# Altium footprint library Item_pcb.PcbLib: 282 footprints (part 14 of 18)
Each footprint in its own frame and in the unit in brackets; x right, y up, seen from the top. Pads: shape width x height; smd on the part's side, far side on the other; paste and mask are expansions set on the pad; w line width, h text height; cw(c..) or ccw(c..) is an arc to the next point about the centre after c.
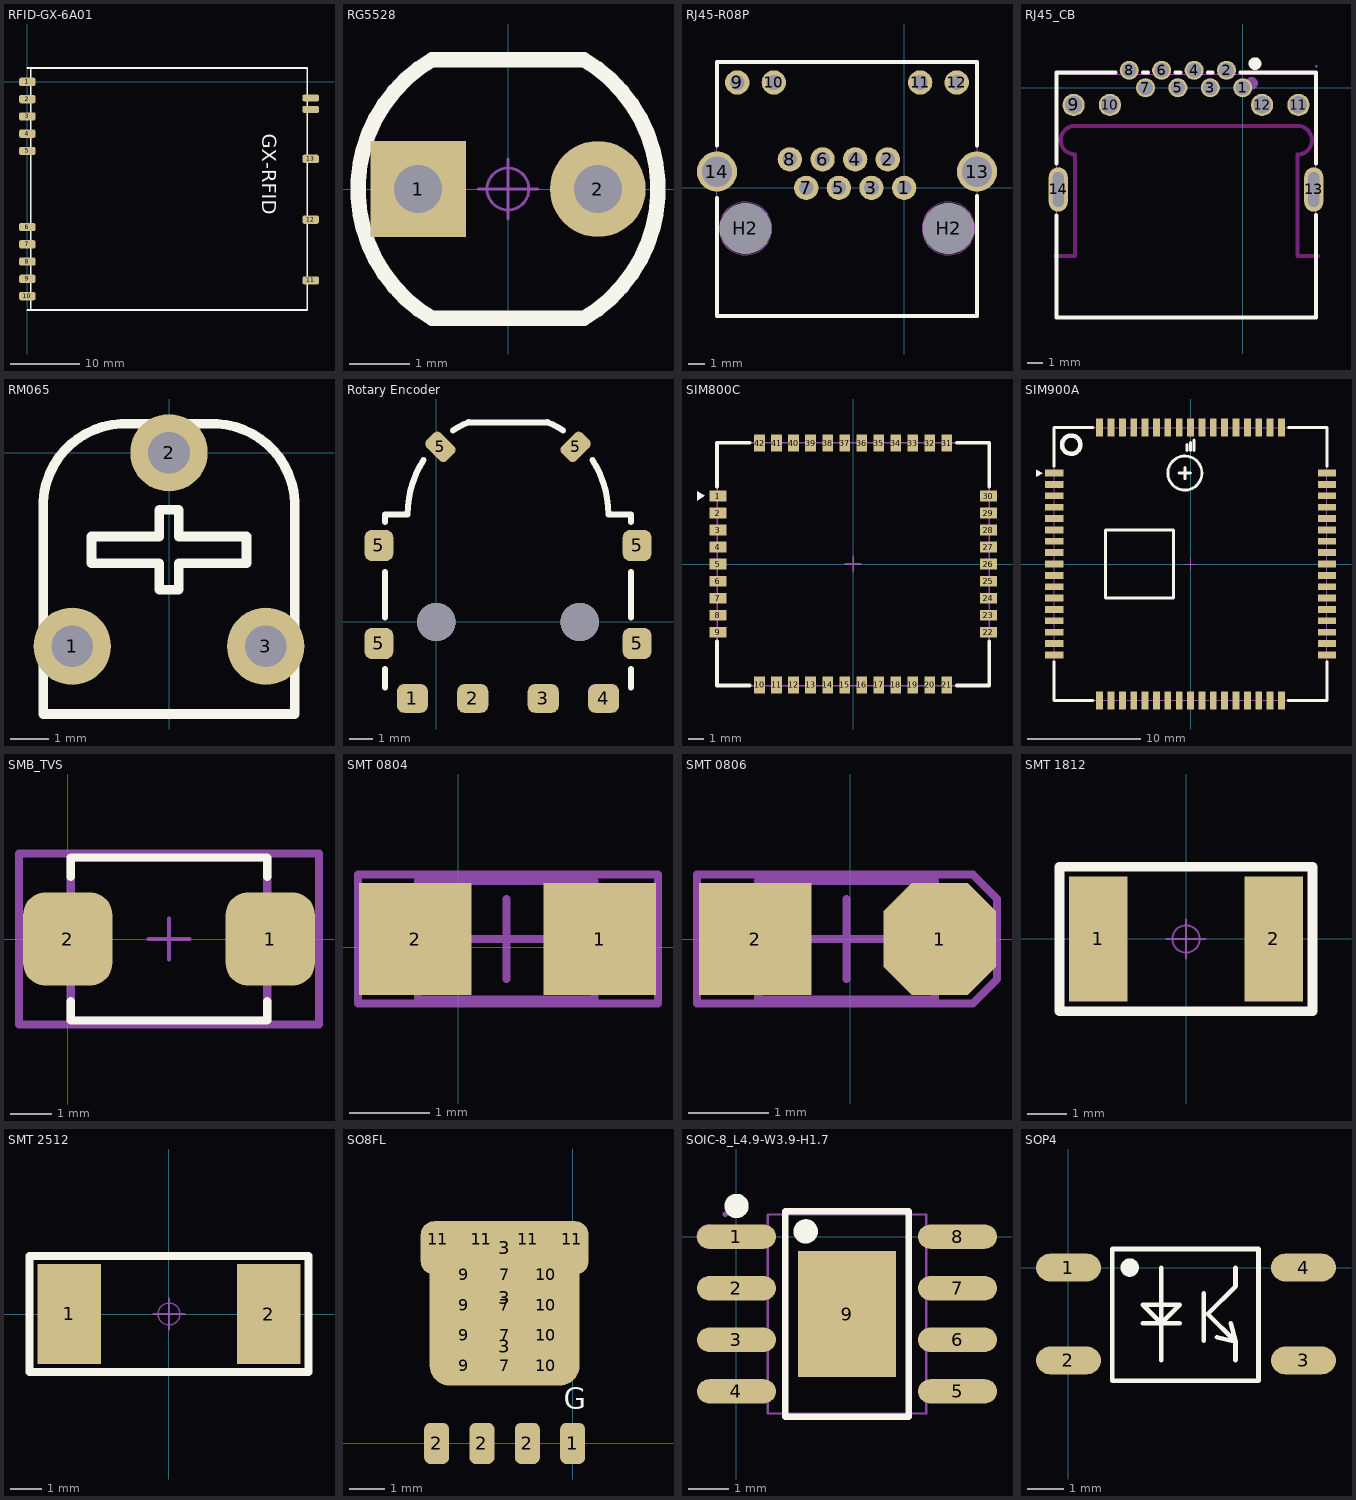
[diagram p13: the footprints below, top view; thin cyan lines are the x and y axes]

## RFID-GX-6A01 [mm]
pads (15):
  rrect50% 2.4x1.2 smd: 1(0,0) 2(0,-2.5) 3(0,-5) 4(0,-7.5) 5(0,-10) 6(0,-21) 7(0,-23.5) 8(0,-26) 9(0,-28.5) 10(0,-31) 11(41,-28.735) 12(41,-19.935) 13(41,-11.135)
  rrect50% 2.4x1 smd: 14(41,-3.985) 15(41,-2.335)
Top Overlay:
  lines w0.254: 0,-33 0.5,-33 ; 0,2 0.5,2 ; 0.5,-33 0.5,2 ; 0.5,-33 40.5,-33 40.5,2 0.5,2
  text "GX-RFID" at 33.274,-7.493 h3.56
3D body: height 3, standoff 0.1, extent 0.508,-33.02 40.64,2.032

## RG5528 [mm] "LIght"
pads (2):
  rect 1.6x1.6 hole 0.8: 1(-1.5,0)
  round 1.6 hole 0.8: 2(1.5,0)
Top Overlay:
  lines w0.254: -1.27,-2.159 cw(c0,0) -1.27,2.159 1.27,2.159 cw(c0,0) 1.27,-2.159 -1.27,-2.159
Mechanical 15:
  circle w0.05: c0,0 r0.35
  lines w0.05: -0.5,0 0.5,0 ; 0,-0.5 0,0.5
3D body "RG5528.STEP": height 4.9, standoff -0.45, extent -2.5,-2.15 2.5,2.15

## RJ45-R08P [mil]
pads (16):
  round 60 hole 36: 1(0,0) 2(-40.16,70.08) 3(-80.31,0.01) 4(-120.47,70.08) 5(-160.63,0) 6(-200.79,70.08) 7(-240.94,0.01) 8(-281.1,70.08) 9(-410.63,259.45) 10(-320.47,259.45) 11(39.37,259.45) 12(129.53,259.45)
  round 98.42 hole 74.8: 13(179.53,40.16) 14(-460.63,40.16)
  round 125.98 hole 125.98: H2(-390.55,-100) H2(109.45,-100)
Top Overlay:
  lines w10: -460.63,104.72 -460.63,309.72 179.53,309.72 179.53,104.72 ; -460.55,-25.28 -460.55,-315.28 179.45,-315.28 179.45,-20.28
Mechanical 1:
  circle w0.2: c-390.55,-100 r64.96
  circle w0.2: c109.45,-100 r64.96
Mechanical 15:
  region: 179.53,-310.24 178.55,-310.24 177.17,-311.63 177.17,-313.58 178.55,-314.97 179.53,-314.97 180.51,-314.96 181.89,-313.58 181.89,-311.62 180.51,-310.24
  region: -420.67,269.49 -400.59,269.49 -400.59,249.41 -420.67,249.41
  region: -330.51,269.49 -310.43,269.49 -310.43,249.41 -330.51,249.41
  region: 29.33,269.49 49.41,269.49 49.41,249.41 29.33,249.41
  region: 119.49,269.49 139.57,269.49 139.57,249.41 119.49,249.41
  region: 167.72,10.63 167.72,69.69 179.53,69.69 179.53,10.63
  region: -460.63,10.63 -460.63,69.69 -448.82,69.69 -448.82,10.63
  region: -9.84,9.84 9.84,9.84 9.84,-9.84 -9.84,-9.84
  region: -50,79.92 -30.32,79.92 -30.32,60.24 -50,60.24
  region: -90.15,9.84 -70.47,9.84 -70.47,-9.84 -90.15,-9.84
  region: -130.31,79.92 -110.63,79.92 -110.63,60.24 -130.31,60.24
  region: -170.47,9.84 -150.79,9.84 -150.79,-9.84 -170.47,-9.84
  region: -210.63,79.92 -190.95,79.92 -190.95,60.24 -210.63,60.24
  region: -250.78,9.84 -231.1,9.84 -231.1,-9.84 -250.78,-9.84
  region: -290.94,79.92 -271.26,79.92 -271.26,60.24 -290.94,60.24
  lines w2: -460.63,-312.6 -460.63,307.48 179.53,307.48 179.53,-312.6 -460.63,-312.6
3D body "3D_PCB2_2024-03-27-RJ45_end.STEP": height 547.25, standoff -74.8, extent -463.84,-315 183.84,316.89

## RJ45_CB [mm]
pads (14):
  round 1.2 hole 0.92: 1(0,0) 2(-1.02,1.1) 3(-2.04,0) 4(-3.06,1.1) 5(-4.08,0) 6(-5.1,1.1) 7(-6.12,0) 8(-7.14,1.1)
  round 1.4 hole 1.1: 9(-10.645,-1.08) 10(-8.355,-1.08) 11(3.505,-1.08) 12(1.215,-1.08)
  oval 1.2x2.8 hole 0.7 slot 2.2 at 90 deg paste+0 mask+0.05: 13(4.47,-6.4) 14(-11.61,-6.4)
Top Layer:
  region: -6.89,1.35 -6.61,1.35 -6.6,1.36
Top Overlay:
  circle w0.4: c0.77,1.52 r0.2
  lines w0.254: -11.72,-8.024 -11.72,-14.334 -11.72,-14.461 4.558,-14.461 ; -11.72,-4.776 -11.72,0.966 -8.011,0.966 ; -6.269,0.966 -5.971,0.966 ; -4.229,0.966 -3.931,0.966 ; -2.189,0.966 -1.891,0.966 ; -0.149,0.966 4.597,0.966 4.597,-4.779 ; 4.597,-14.461 4.597,-8.021
Keep-Out Layer:
  lines w0.254: -10.554,-10.6 -11.786,-10.6 -10.554,-10.6 ; -10.554,-10.6 -10.554,-4.196 ; -10.554,-10.6 -10.554,-4.196 ; -10.554,-4.196 cw(c-10.555,-3.296) -10.555,-2.396 ; -10.554,-4.196 cw(c-10.555,-3.296) -10.555,-2.396 ; -10.555,-2.396 3.415,-2.396 -10.555,-2.396 ; 3.455,-10.6 4.724,-10.6 3.455,-10.6 ; 3.455,-10.6 3.455,-4.2 ; 3.455,-10.6 3.455,-4.2 ; 3.455,-4.2 ccw(c3.454,-3.3) 3.454,-2.4 cw(c3.454,-3.3) 3.455,-4.2
Mechanical 6:
  circle w0.4: c0.55,0.28 r0.2
Mechanical 15:
  region: -0.77,1.35 -1.27,1.35 -1.27,0.83 -0.77,0.83
  region: -2.81,1.35 -3.31,1.35 -3.31,0.83 -2.81,0.83
  region: -4.85,1.35 -5.35,1.35 -5.35,0.83 -4.85,0.83
  region: -6.89,1.35 -7.39,1.35 -7.39,0.83 -6.89,0.83
  region: 4.32,-5.4 4.62,-5.4 4.62,-7.4 4.32,-7.4
  region: -11.76,-5.4 -11.46,-5.4 -11.46,-7.4 -11.76,-7.4
  region: -8.605,-0.73 -8.105,-0.73 -8.105,-1.43 -8.605,-1.43
  region: -10.895,-0.73 -10.395,-0.73 -10.395,-1.43 -10.895,-1.43
  region: 0.965,-0.73 1.465,-0.73 1.465,-1.43 0.965,-1.43
  region: 3.255,-0.73 3.755,-0.73 3.755,-1.43 3.255,-1.43
  region: -0.25,0.25 0.25,0.25 0.25,-0.25 -0.25,-0.25
  region: -1.27,1.35 -0.77,1.35 -0.77,0.85 -1.27,0.85
  region: -2.29,0.25 -1.79,0.25 -1.79,-0.25 -2.29,-0.25
  region: -3.31,1.35 -2.81,1.35 -2.81,0.85 -3.31,0.85
  region: -4.33,0.25 -3.83,0.25 -3.83,-0.25 -4.33,-0.25
  region: -5.35,1.35 -4.85,1.35 -4.85,0.85 -5.35,0.85
  region: -6.37,0.25 -5.87,0.25 -5.87,-0.25 -6.37,-0.25
  region: -7.39,1.35 -6.89,1.35 -6.89,0.85 -7.39,0.85
  region: 4.68,1.35 4.679,1.375 4.644,1.409 4.595,1.409 4.561,1.374 4.56,1.35 4.561,1.325 4.596,1.291 4.645,1.291 4.679,1.326
  lines w0.051: -11.72,-14.461 -11.72,0.839 4.58,0.839 4.58,-14.461 -11.72,-14.461

## RM065 [mil] "蓝白可调电位器"
pads (3):
  round 80 hole 43.31: 1(-100,-200) 2(0,0) 3(100,-200)
Top Overlay:
  lines w10: -130,-270 130,-270 130,-50 ccw(c45,-55) 40,30 -40,30 ccw(c-45,-55) -130,-50 -130,-270 ; -80,-114.17 -80,-86.61 -10,-86.61 -10,-70 -10,-59.06 10,-59.06 10,-86.61 80,-86.61 80,-114.17 10,-114.17 10,-141.73 -10,-141.73 -10,-114.17 -80,-114.17
3D body "RM065.STEP": height 299.21, standoff -137.8, extent -127.95,-268.83 127.96,29.59

## Rotary Encoder [mm]
pads (10):
  rrect50% 1.3x1.2 smd: 1(-1,-3.2) 2(1.525,-3.2) 3(4.475,-3.2) 4(7,-3.2)
  rrect50% 1.2x1.3 smd: 5(-2.4,-0.9) 5(-2.4,3.2) 5(8.4,-0.9) 5(8.4,3.2)
  rrect50% 0.85x1.2 smd rot 45: 5(0.172,7.328)
  rrect50% 0.85x1.2 smd rot 135: 5(5.828,7.328)
via 6,0 diameter 1.6 hole 1.6
via 0,0 diameter 1.6 hole 1.6
Top Overlay:
  lines w0.254: -2.15,-2.75 -2.15,-1.977 ; -2.15,0.182 -2.15,2.098 ; -2.15,4.176 -2.15,4.5 -1.2,4.5 cw(c3,4.5) -0.533,6.771 ; 0.702,8.015 cw(c3,4.5) 1.345,8.36 ; 1.345,8.35 4.655,8.35 ; 4.655,8.36 cw(c3,4.5) 5.298,8.015 ; 6.533,6.771 cw(c3,4.5) 7.2,4.5 8.15,4.5 8.15,4.176 ; 8.15,-2.75 8.15,-1.977 ; 8.15,0.182 8.15,2.098
3D body "RE.step": height 4.06, standoff -0.44, extent -4.199,-3 10.199,11.75

## SIM800C [mm]
pads (42):
  rect 1.1x0.7 smd: 1(-8.75,4.39) 2(-8.75,3.29) 3(-8.75,2.19) 4(-8.75,1.09) 5(-8.75,-0.01) 6(-8.75,-1.11) 7(-8.75,-2.21) 8(-8.75,-3.31) 9(-8.75,-4.41) 22(8.75,-4.41) 23(8.75,-3.31) 24(8.75,-2.21) 25(8.75,-1.11) 26(8.75,-0.01) 27(8.75,1.09) 28(8.75,2.19) 29(8.75,3.29) 30(8.75,4.39)
  rect 0.7x1.1 smd: 10(-6.05,-7.81) 11(-4.95,-7.81) 12(-3.85,-7.81) 13(-2.75,-7.81) 14(-1.65,-7.81) 15(-0.55,-7.81) 16(0.55,-7.81) 17(1.65,-7.81) 18(2.75,-7.81) 19(3.85,-7.81) 20(4.95,-7.81) 21(6.05,-7.81) 31(6.05,7.81) 32(4.95,7.81) 33(3.85,7.81) 34(2.75,7.81) 35(1.65,7.81) 36(0.55,7.81) 37(-0.55,7.81) 38(-1.65,7.81) 39(-2.75,7.81) 40(-3.85,7.81) 41(-4.95,7.81) 42(-6.05,7.81)
Top Overlay:
  region: -9.6,4.4 -10.1,4.7 -10.1,4.1
  lines w0.254: -8.8,-5 -8.8,-7.86 -6.7,-7.86 ; -8.8,5 -8.8,7.84 -6.7,7.84 ; 6.7,-7.86 8.8,-7.86 8.8,-5 ; 6.7,7.84 8.8,7.84 8.8,5
Mechanical 15:
  lines w0.1: -0.5,0 0.5,0 ; 0,-0.5 0,0.5 ; -8.8,-7.86 8.8,-7.86 8.8,7.84 -8.8,7.84 -8.8,-7.86
3D body "SIM800C.STEP": height 2.37, standoff 0.03, extent -8.8,-7.86 8.8,7.84

## SIM900A [mm]
pads (68):
  rect 1.6x0.6 smd: 1(-12,8) 2(-12,7) 3(-12,6) 4(-12,5) 5(-12,4) 6(-12,3) 7(-12,2) 8(-12,1) 9(-12,0) 10(-12,-1) 11(-12,-2) 12(-12,-3) 13(-12,-4) 14(-12,-5) 15(-12,-6) 16(-12,-7) 17(-12,-8) 35(12,-8) 36(12,-7) 37(12,-6) 38(12,-5) 39(12,-4) 40(12,-3) 41(12,-2) 42(12,-1) 43(12,0) 44(12,1) 45(12,2) 46(12,3) 47(12,4) 48(12,5) 49(12,6) 50(12,7) 51(12,8)
  rect 0.6x1.6 smd: 18(-8,-12) 19(-7,-12) 20(-6,-12) 21(-5,-12) 22(-4,-12) 23(-3,-12) 24(-2,-12) 25(-1,-12) 26(0,-12) 27(1,-12) 28(2,-12) 29(3,-12) 30(4,-12) 31(5,-12) 32(6,-12) 33(7,-12) 34(8,-12) 52(8,12) 53(7,12) 54(6,12) 55(5,12) 56(4,12) 57(3,12) 58(2,12) 59(1,12) 60(0,12) 61(-1,12) 62(-2,12) 63(-3,12) 64(-4,12) 65(-5,12) 66(-6,12) 67(-7,12) 68(-8,12)
Top Overlay:
  circle w0.4: c-10.5,10.5 r0.806
  circle w0.254: c-0.5,8 r1.5
  region: -13,8 -13.6,8.3 -13.6,7.7
  lines w0.254: -12,-8.6 -12,-12 -8.6,-12 ; -12,8.6 -12,12 -8.6,12 ; -1,8 0,8 ; -0.5,7.5 -0.5,8.5 ; -0.3,10 -0.3,10.5 ; 0,10 0,10.7 ; 0.3,10 0.3,10.9 ; 8.6,-12 12,-12 12,-8.6 ; 8.637,12 12,12 12,8.6 ; -7.5,-3 -1.5,-3 -1.5,3 -7.5,3 -7.5,-3
Mechanical 15:
  lines w0.1: -0.5,0 0.5,0 ; 0,-0.5 0,0.5 ; -12,-12 -12,12 12,12 12,-12 -12,-12
3D body "SIM900A.step": height 3.02, standoff 0, extent -12,-12 12,12

## SMB_TVS [mm]
pads (2):
  rrect50% 2.16x2.26 smd paste+0 mask+0: 1(4.9,0) 2(0,0)
Top Overlay:
  lines w0.2: 0.075,-1.505 0.075,-1.97 4.825,-1.97 4.825,-1.505 ; 0.075,1.505 0.075,1.97 4.825,1.97 4.825,1.505
Mechanical 10:
  lines w0.2: -1.18,-2.07 6.08,-2.07 6.08,2.07 -1.18,2.07 -1.18,-2.07
Mechanical 12:
  lines w0.2: 0.075,-1.97 4.825,-1.97 4.825,1.97 0.075,1.97 0.075,-1.97
Mechanical 15:
  lines w0.1: 1.95,0 2.95,0 ; 2.45,-0.5 2.45,0.5
  lines w0.2: -1.18,-2.07 6.08,-2.07 6.08,2.07 -1.18,2.07 -1.18,-2.07
3D body "Diode_Littelfuse_Inc_SMBJ28CA_eec.STEP": height 2.62, standoff 0, extent -0.25,-1.81 5.15,1.81

## SMT 0804 [mm]
pads (2):
  rect 1.4x1.4 smd: 1(1.767,0.102) 2(-0.533,0.102)
Mechanical 13:
  lines w0.1: -0.498,-0.652 -0.498,0.827 1.702,0.827 1.702,-0.652 -0.498,-0.652
Mechanical 15:
  lines w0.1: 0.102,0.102 1.102,0.102 ; 0.602,-0.398 0.602,0.602 ; -1.245,-0.698 -1.245,0.902 2.489,0.902 2.489,-0.698 -1.245,-0.698
3D body "RESC2012(0805).STEP": height 0.5, standoff 0, extent -0.398,-0.498 1.602,0.702

## SMT 0806 [mm]
pads (2):
  oct 1.4x1.4 smd: 1(1.114,0)
  rect 1.4x1.4 smd: 2(-1.186,0)
Mechanical 13:
  lines w0.1: -1.151,-0.754 -1.151,0.725 1.049,0.725 1.049,-0.754 -1.151,-0.754
Mechanical 15:
  lines w0.1: -0.551,0 0.449,0 ; -0.051,-0.5 -0.051,0.5 ; -1.91,-0.8 -1.91,0.8 1.524,0.8 1.824,0.5 1.824,-0.5 1.524,-0.8 -1.91,-0.8
3D body "LED0805(R).STEP": height 1.1, standoff 0, extent -1.061,-0.625 0.959,0.625

## SMT 1812 [mm]
pads (2):
  rect 1.5x3.2 smd: 1(-2.25,0) 2(2.25,0)
Top Overlay:
  lines w0.254: -3.251,-1.854 -1.27,-1.854 3.251,-1.854 3.251,1.854 -1.27,1.854 -3.251,1.854 -3.251,-1.854
Mechanical 15:
  circle w0.05: c0,0 r0.35
  lines w0.05: -0.5,0 0.5,0 ; 0,-0.5 0,0.5
3D body "R 1812.STEP": height 0.55, standoff -0.01, extent -2.25,-1.6 2.25,1.6

## SMT 2512 [mm] "64mm*32mm"
pads (2):
  rect 2.032x3.2 smd: 1(-3.2,0) 2(3.2,0)
Top Overlay:
  lines w0.254: -4.47,-1.854 4.47,-1.854 4.47,1.854 -4.47,1.854 -4.47,-1.854
Mechanical 15:
  circle w0.05: c0,0 r0.35
  lines w0.05: -0.5,0 0.5,0 ; 0,-0.5 0,0.5
3D body "R 2512.STEP": height 0.55, standoff -0.02, extent -3.2,-1.6 3.2,1.6

## SO8FL [mm]
pads (23):
  rrect50% 0.7x1.15 smd paste-0.05 mask+0.075: 1(0,0) 2(-3.81,0) 2(-2.54,0) 2(-1.27,0)
  rrect50% 4.2x2.2 smd paste-10 mask+0.075: 3(-1.905,2.725)
  rect 4.2x2.2 smd paste-10 mask+0.075: 3(-1.905,4.075)
  rrect50% 4.7x1.5 smd paste-10 mask+0.075: 3(-1.905,5.475)
  rect 0.9x0.6 on Top Paste: 7(-1.905,2.175) 7(-1.905,3.025) 7(-1.905,3.875) 7(-1.905,4.725) 9(-3.055,2.175) 9(-3.055,3.025) 9(-3.055,3.875) 9(-3.055,4.725) 10(-0.755,2.175) 10(-0.755,3.025) 10(-0.755,3.875) 10(-0.755,4.725)
  rect 0.6x0.9 on Top Paste: 11(-3.78,5.725) 11(-2.555,5.725) 11(-1.255,5.725) 11(-0.03,5.725)
Top Overlay:
  text "G" at -0.253,0.771 h1.02
3D body "User Library-DFN5x6_SO8FL.STEP": height 1.13, standoff 0, extent -4.48,-0.225 0.67,5.925

## SOIC-8_L4.9-W3.9-H1.7 [mm]
pads (9):
  oval 1.941x0.602 smd: 1(0,0) 2(0,-1.27) 3(0,-2.54) 4(0,-3.81) 5(5.441,-3.81) 6(5.441,-2.54) 7(5.441,-1.27) 8(5.441,0)
  rect 2.41x3.098 smd: 9(2.721,-1.905)
Top Overlay:
  circle w0.3: c0,0.753 r0.15
  circle w0.3: c1.705,0.127 r0.15
  lines w0.152: 1.199,-4.431 1.199,0.621 4.242,0.621 4.242,-4.431 1.199,-4.431
Mechanical 6:
  circle w0.3: c-0.679,0 r0.15
Mechanical 15:
  region: 3.926,-0.356 3.926,-3.454 1.516,-3.454 1.516,-0.356
  region: 5.081,-3.595 4.661,-3.595 4.661,-4.025 5.081,-4.025
  region: 5.721,-3.595 5.071,-3.595 5.071,-4.025 5.721,-4.025
  region: 5.081,-2.325 4.661,-2.325 4.661,-2.755 5.081,-2.755
  region: 5.721,-2.325 5.071,-2.325 5.071,-2.755 5.721,-2.755
  region: 5.081,-1.055 4.661,-1.055 4.661,-1.485 5.081,-1.485
  region: 5.721,-1.055 5.071,-1.055 5.071,-1.485 5.721,-1.485
  region: 5.081,0.215 4.661,0.215 4.661,-0.215 5.081,-0.215
  region: 5.721,0.215 5.071,0.215 5.071,-0.215 5.721,-0.215
  region: 0.361,-3.595 0.781,-3.595 0.781,-4.025 0.361,-4.025
  region: -0.279,-3.595 0.371,-3.595 0.371,-4.025 -0.279,-4.025
  region: 0.361,-2.325 0.781,-2.325 0.781,-2.755 0.361,-2.755
  region: -0.279,-2.325 0.371,-2.325 0.371,-2.755 -0.279,-2.755
  region: 0.361,-1.055 0.781,-1.055 0.781,-1.485 0.361,-1.485
  region: -0.279,-1.055 0.371,-1.055 0.371,-1.485 -0.279,-1.485
  region: 0.361,0.215 0.781,0.215 0.781,-0.215 0.361,-0.215
  region: -0.279,0.215 0.371,0.215 0.371,-0.215 -0.279,-0.215
  region: -0.279,0.485 -0.255,0.485 -0.219,0.52 -0.219,0.57 -0.254,0.605 -0.279,0.605 -0.304,0.605 -0.339,0.57 -0.339,0.52 -0.304,0.485
  lines w0.051: 0.771,-4.355 0.771,0.545 4.671,0.545 4.671,-4.355 0.771,-4.355
3D body "SOIC8.STEP": height 1.75, standoff 0, extent -0.254,-4.405 5.758,0.595

## SOP4 [mil] "AQY211G2S"
pads (4):
  oval 70x30 smd: 1(0,0) 2(0,-100) 3(253.23,-100) 4(253.23,0)
Top Overlay:
  circle w10: c65.94,0 r4.92
  lines w5: 80,-60 120,-60 ; 100,-100 100,0 ; 145.67,-78.74 145.67,-27.56 ; 160,-75 180,-80 ; 175,-60 180,-80 ; 180,-100 180,-80 ; 180,0 180,-20 150,-50 180,-80 ; 47.24,-121.73 47.24,20 204.72,20 204.72,-121.73 47.24,-121.73 ; 80,-40 120,-40 100,-60 80,-40
3D body "User Library-HCPL-181-1.STEP": height 78.74, standoff -3.96, extent -7.87,-122.05 267.72,19.69